# Altium footprint library Test.PcbLib: 245 footprints (part 6 of 17)
Each footprint in its own frame and in the unit in brackets; x right, y up, seen from the top. Pads: shape width x height; smd on the part's side, far side on the other; paste and mask are expansions set on the pad; w line width, h text height; cw(c..) or ccw(c..) is an arc to the next point about the centre after c.
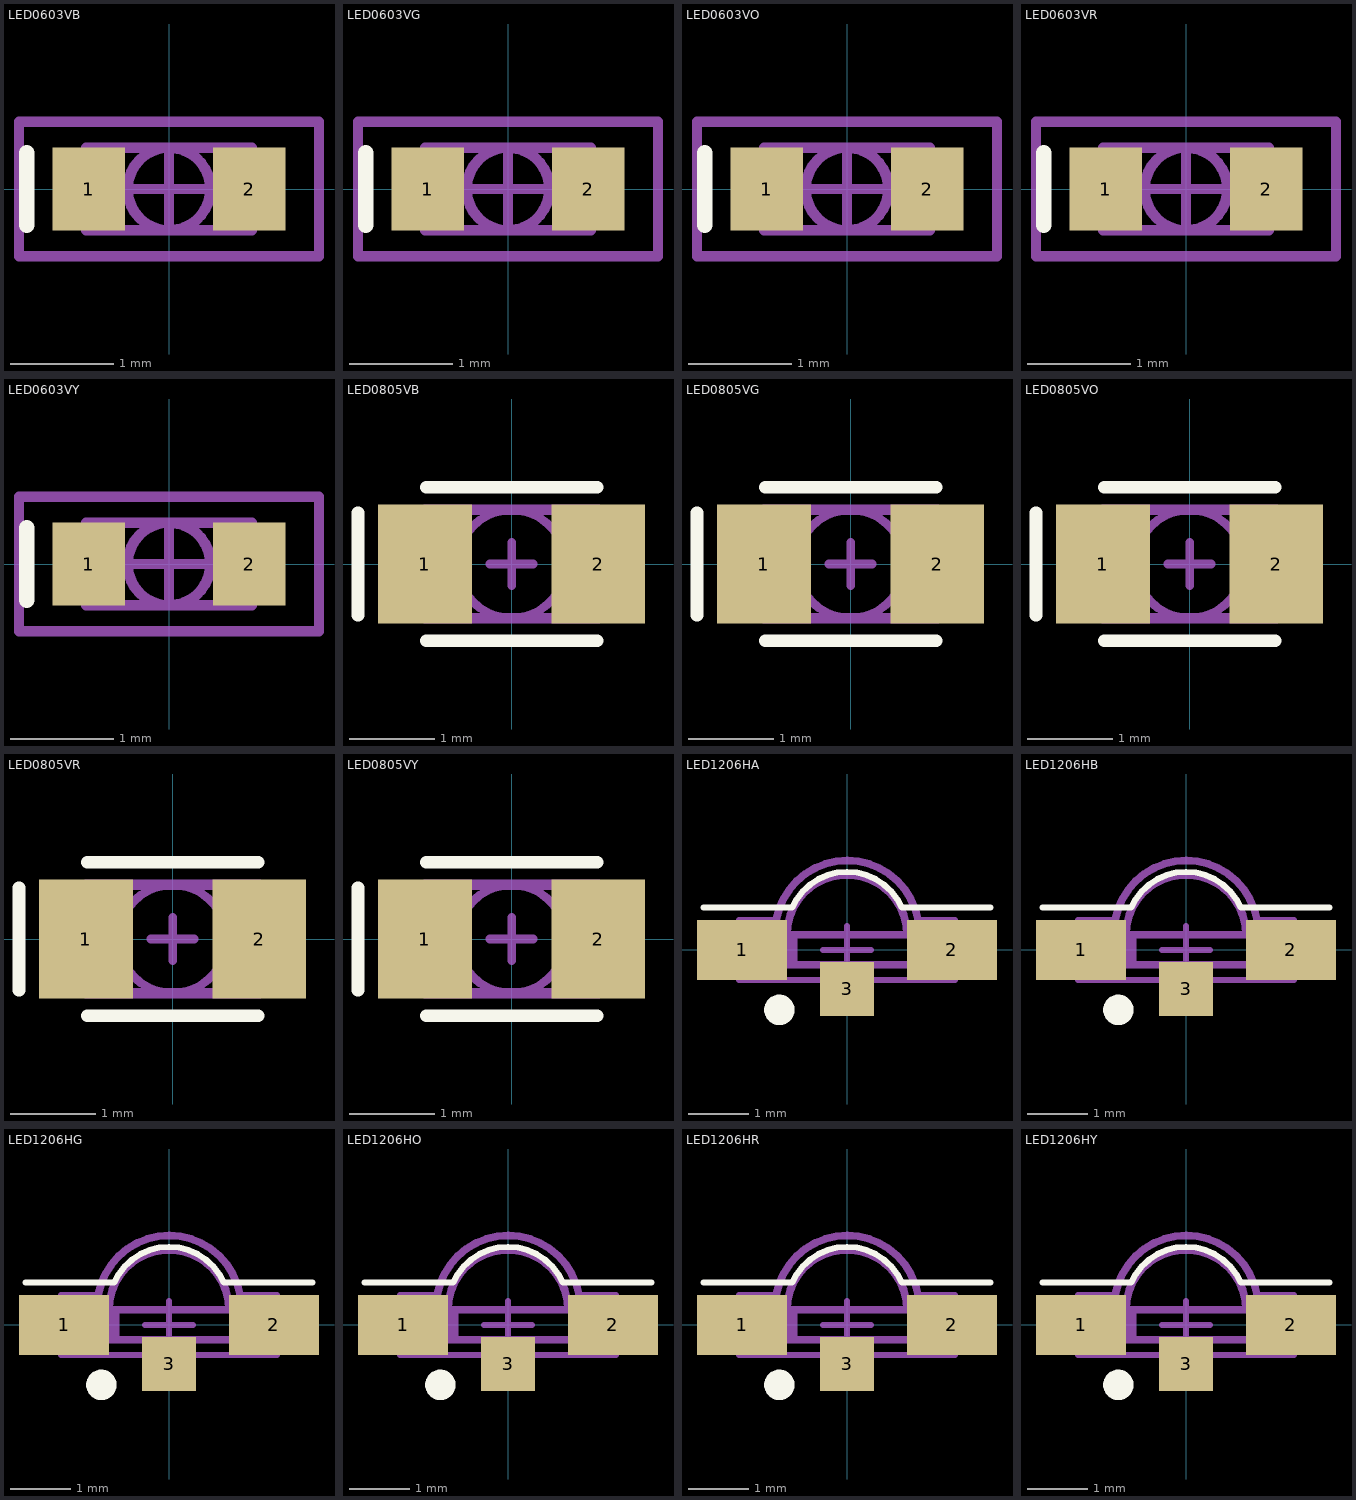
[diagram p5: the footprints below, top view; thin cyan lines are the x and y axes]

## LED0603VB [mm] "LED chip 0603 1.6x0.8x0.6mm vertical Blue"
height 0.6
pads (2):
  rect 0.7x0.8 smd: 1(-0.775,0) 2(0.775,0)
Top Overlay:
  lines w0.15: -1.375,-0.35 -1.375,0.35
Mechanical 13:
  circle w0.102: c0,0 r0.4
  rectangle: -0.8,-0.4 -0.5,0.4
  lines w0.1: -0.8,-0.4 -0.8,0.4 0.8,0.4 0.8,-0.4 -0.8,-0.4
Mechanical 15:
  lines w0.1: -0.4,0 0.4,0 ; 0,-0.4 0,0.4 ; -1.45,-0.65 -1.45,0.65 1.45,0.65 1.45,-0.65 -1.45,-0.65
3D body: height 0.6, standoff 0.3, extent -0.8,-0.4 0.8,0.4
3D body: height 0.3, standoff 0, extent -0.8,-0.4 0.8,0.4

## LED0603VG [mm] "LED chip 0603 1.6x0.8x0.6mm vertical Green"
height 0.6
pads (2):
  rect 0.7x0.8 smd: 1(-0.775,0) 2(0.775,0)
Top Overlay:
  lines w0.15: -1.375,-0.35 -1.375,0.35
Mechanical 13:
  circle w0.102: c0,0 r0.4
  rectangle: -0.8,-0.4 -0.5,0.4
  lines w0.1: -0.8,-0.4 0.8,-0.4 0.8,0.4 -0.8,0.4 -0.8,-0.4
Mechanical 15:
  lines w0.1: -0.4,0 0.4,0 ; 0,-0.4 0,0.4 ; -1.45,-0.65 1.45,-0.65 1.45,0.65 -1.45,0.65 -1.45,-0.65
3D body: height 0.6, standoff 0.3, extent -0.8,-0.4 0.8,0.4
3D body: height 0.3, standoff 0, extent -0.8,-0.4 0.8,0.4

## LED0603VO [mm] "LED chip 0603 1.6x0.8x0.6mm vertical Orange"
height 0.6
pads (2):
  rect 0.7x0.8 smd: 1(-0.775,0) 2(0.775,0)
Top Overlay:
  lines w0.15: -1.375,-0.35 -1.375,0.35
Mechanical 13:
  circle w0.102: c0,0 r0.4
  rectangle: -0.8,-0.4 -0.5,0.4
  lines w0.1: -0.8,-0.4 0.8,-0.4 0.8,0.4 -0.8,0.4 -0.8,-0.4
Mechanical 15:
  lines w0.1: -0.4,0 0.4,0 ; 0,-0.4 0,0.4 ; -1.45,-0.65 1.45,-0.65 1.45,0.65 -1.45,0.65 -1.45,-0.65
3D body: height 0.6, standoff 0.3, extent -0.8,-0.4 0.8,0.4
3D body: height 0.3, standoff 0, extent -0.8,-0.4 0.8,0.4

## LED0603VR [mm] "LED chip 0603 1.6x0.8x0.6mm vertical Red"
height 0.6
pads (2):
  rect 0.7x0.8 smd: 1(-0.775,0) 2(0.775,0)
Top Overlay:
  lines w0.15: -1.375,-0.35 -1.375,0.35
Mechanical 13:
  circle w0.102: c0,0 r0.4
  rectangle: -0.8,-0.4 -0.5,0.4
  lines w0.1: -0.8,-0.4 -0.8,0.4 0.8,0.4 0.8,-0.4 -0.8,-0.4
Mechanical 15:
  lines w0.1: -0.4,0 0.4,0 ; 0,-0.4 0,0.4 ; -1.45,-0.65 -1.45,0.65 1.45,0.65 1.45,-0.65 -1.45,-0.65
3D body: height 0.3, standoff 0, extent -0.8,-0.4 0.8,0.4
3D body: height 0.6, standoff 0.3, extent -0.8,-0.4 0.8,0.4

## LED0603VY [mm] "LED chip 0603 1.6x0.8x0.6mm vertical Yellow"
height 0.6
pads (2):
  rect 0.7x0.8 smd: 1(-0.775,0) 2(0.775,0)
Top Overlay:
  lines w0.15: -1.375,-0.35 -1.375,0.35
Mechanical 13:
  circle w0.102: c0,0 r0.4
  rectangle: -0.8,-0.4 -0.5,0.4
  lines w0.1: -0.8,-0.4 -0.8,0.4 0.8,0.4 0.8,-0.4 -0.8,-0.4
Mechanical 15:
  lines w0.1: -0.4,0 0.4,0 ; 0,-0.4 0,0.4 ; -1.45,-0.65 -1.45,0.65 1.45,0.65 1.45,-0.65 -1.45,-0.65
3D body: height 0.3, standoff 0, extent -0.8,-0.4 0.8,0.4
3D body: height 0.6, standoff 0.3, extent -0.8,-0.4 0.8,0.4

## LED0805VB [mm] "LED 0805 2X1.25mm Blue"
height 1.1
pads (2):
  rect 1.1x1.4 smd: 1(-1.016,0) 2(1.016,0)
Top Overlay:
  lines w0.15: -1.8,-0.6 -1.8,0.6 ; -1,-0.9 1,-0.9 ; -1,0.9 1,0.9
Mechanical 13:
  circle w0.1: c0,0 r0.635
  lines w0.102: -0.9,0.635 -0.9,-0.635 -0.8,-0.635 -0.8,0.635 -0.7,0.635 -0.7,-0.635
  lines w0.127: -1.016,-0.635 1.016,-0.635 1.016,0.635 -1.016,0.635 -1.016,-0.635
Mechanical 15:
  lines w0.1: -0.254,0 0.254,0 ; 0,-0.254 0,0.254
3D body: height 1, standoff 0.3, extent -0.75,-0.625 0.75,0.625
3D body: height 0.3, standoff 0, extent -1.016,-0.635 1.016,0.635

## LED0805VG [mm] "LED 0805 2X1.25mm Green"
height 1.1
pads (2):
  rect 1.1x1.4 smd: 1(-1.016,0) 2(1.016,0)
Top Overlay:
  lines w0.15: -1.8,-0.6 -1.8,0.6 ; -1,-0.9 1,-0.9 ; -1,0.9 1,0.9
Mechanical 13:
  circle w0.1: c0,0 r0.635
  lines w0.102: -0.9,0.635 -0.9,-0.635 -0.8,-0.635 -0.8,0.635 -0.7,0.635 -0.7,-0.635
  lines w0.127: -1.016,-0.635 1.016,-0.635 1.016,0.635 -1.016,0.635 -1.016,-0.635
Mechanical 15:
  lines w0.1: -0.254,0 0.254,0 ; 0,-0.254 0,0.254
3D body: height 1, standoff 0.3, extent -0.75,-0.625 0.75,0.625
3D body: height 0.3, standoff 0, extent -1.016,-0.635 1.016,0.635

## LED0805VO [mm] "LED 0805 2X1.25mm Orange"
height 1.1
pads (2):
  rect 1.1x1.4 smd: 1(-1.016,0) 2(1.016,0)
Top Overlay:
  lines w0.15: -1.8,-0.6 -1.8,0.6 ; -1,-0.9 1,-0.9 ; -1,0.9 1,0.9
Mechanical 13:
  circle w0.1: c0,0 r0.635
  lines w0.102: -0.9,0.635 -0.9,-0.635 -0.8,-0.635 -0.8,0.635 -0.7,0.635 -0.7,-0.635
  lines w0.127: -1.016,-0.635 1.016,-0.635 1.016,0.635 -1.016,0.635 -1.016,-0.635
Mechanical 15:
  lines w0.1: -0.254,0 0.254,0 ; 0,-0.254 0,0.254
3D body: height 1, standoff 0.3, extent -0.75,-0.625 0.75,0.625
3D body: height 0.3, standoff 0, extent -1.016,-0.635 1.016,0.635

## LED0805VR [mm] "LED 0805 2X1.25mm Red"
height 1.1
pads (2):
  rect 1.1x1.4 smd: 1(-1.016,0) 2(1.016,0)
Top Overlay:
  lines w0.15: -1.8,-0.6 -1.8,0.6 ; -1,-0.9 1,-0.9 ; -1,0.9 1,0.9
Mechanical 13:
  circle w0.1: c0,0 r0.635
  lines w0.102: -0.9,0.635 -0.9,-0.635 -0.8,-0.635 -0.8,0.635 -0.7,0.635 -0.7,-0.635
  lines w0.127: -1.016,-0.635 1.016,-0.635 1.016,0.635 -1.016,0.635 -1.016,-0.635
Mechanical 15:
  lines w0.1: -0.254,0 0.254,0 ; 0,-0.254 0,0.254
3D body: height 1, standoff 0.3, extent -0.75,-0.625 0.75,0.625
3D body: height 0.3, standoff 0, extent -1.016,-0.635 1.016,0.635

## LED0805VY [mm] "LED 0805 2X1.25mm Yellow"
height 1.1
pads (2):
  rect 1.1x1.4 smd: 1(-1.016,0) 2(1.016,0)
Top Overlay:
  lines w0.15: -1.8,-0.6 -1.8,0.6 ; -1,-0.9 1,-0.9 ; -1,0.9 1,0.9
Mechanical 13:
  circle w0.1: c0,0 r0.635
  lines w0.102: -0.9,0.635 -0.9,-0.635 -0.8,-0.635 -0.8,0.635 -0.7,0.635 -0.7,-0.635
  lines w0.127: -1.016,-0.635 1.016,-0.635 1.016,0.635 -1.016,0.635 -1.016,-0.635
Mechanical 15:
  lines w0.1: -0.254,0 0.254,0 ; 0,-0.254 0,0.254
3D body: height 1, standoff 0.3, extent -0.75,-0.625 0.75,0.625
3D body: height 0.3, standoff 0, extent -1.016,-0.635 1.016,0.635

## LED1206HA [mm] "LED chip C110 3.2x1.0x1.5mm Side Amber"
height 1.5
pads (3):
  rect 1.5x1 smd: 1(-1.75,0) 2(1.75,0)
  rect 0.9x0.9 smd mask+0.1: 3(0,-0.65)
Top Overlay:
  circle w0.254: c-1.127,-1 r0.127
  lines w0.102: -2.394,0.706 -0.914,0.706 cw(c0,0.3) 0.914,0.706 2.394,0.706
Mechanical 13:
  region: -0.825,0.25 -1.375,0.25 -1.375,-0.25 -0.825,-0.25
  lines w0.127: -1,0.25 cw(c0,0.25) 1,0.25 ; -1.6,-0.25 -1.6,0.25 1.6,0.25 1.6,-0.25 -1.6,-0.25
Mechanical 15:
  lines w0.1: -1.175,0.5 -1.8,0.5 -1.8,-0.5 1.8,-0.5 1.8,0.5 1.175,0.5
  lines w0.102: -0.4,0 0.4,0 ; 0,-0.4 0,0.4
  lines w0.127: -1.177,0.509 cw(c0.003,0.29) 1.183,0.506
3D body: height 1, standoff 0, extent -0.9,-0.25 0.9,0.25
3D body: height 1, standoff 0, extent 0.9,-0.25 1.6,0.25
3D body: height 1, standoff 0, extent -1.6,-0.25 -0.9,0.25
3D body: height 1, standoff 0, extent -1.009,0.25 1.009,1.259
3D body: height 1.02, standoff 0, extent -0.775,-0.325 -0.5,0.25

## LED1206HB [mm] "LED chip C110 3.2x1.0x1.5mm Side Blue"
height 1.5
pads (3):
  rect 1.5x1 smd: 1(-1.75,0) 2(1.75,0)
  rect 0.9x0.9 smd mask+0.1: 3(0,-0.65)
Top Overlay:
  circle w0.254: c-1.127,-1 r0.127
  lines w0.102: -2.394,0.706 -0.914,0.706 cw(c0,0.3) 0.914,0.706 2.394,0.706
Mechanical 13:
  region: -0.825,0.25 -1.375,0.25 -1.375,-0.25 -0.825,-0.25
  lines w0.127: -1,0.25 cw(c0,0.25) 1,0.25 ; -1.6,-0.25 -1.6,0.25 1.6,0.25 1.6,-0.25 -1.6,-0.25
Mechanical 15:
  lines w0.1: -1.175,0.5 -1.8,0.5 -1.8,-0.5 1.8,-0.5 1.8,0.5 1.175,0.5
  lines w0.102: -0.4,0 0.4,0 ; 0,-0.4 0,0.4
  lines w0.127: -1.177,0.509 cw(c0.003,0.29) 1.183,0.506
3D body: height 1, standoff 0, extent -0.9,-0.25 0.9,0.25
3D body: height 1, standoff 0, extent 0.9,-0.25 1.6,0.25
3D body: height 1, standoff 0, extent -1.6,-0.25 -0.9,0.25
3D body: height 1, standoff 0, extent -1.009,0.25 1.009,1.259
3D body: height 1.02, standoff 0, extent -0.775,-0.325 -0.5,0.25

## LED1206HG [mm] "LED chip C110 3.2x1.0x1.5mm Side Green"
height 1.5
pads (3):
  rect 1.5x1 smd: 1(-1.75,0) 2(1.75,0)
  rect 0.9x0.9 smd mask+0.1: 3(0,-0.65)
Top Overlay:
  circle w0.254: c-1.127,-1 r0.127
  lines w0.102: -2.394,0.706 -0.914,0.706 cw(c0,0.3) 0.914,0.706 2.394,0.706
Mechanical 13:
  region: -0.825,0.25 -1.375,0.25 -1.375,-0.25 -0.825,-0.25
  lines w0.127: -1,0.25 cw(c0,0.25) 1,0.25 ; -1.6,-0.25 -1.6,0.25 1.6,0.25 1.6,-0.25 -1.6,-0.25
Mechanical 15:
  lines w0.1: -1.175,0.5 -1.8,0.5 -1.8,-0.5 1.8,-0.5 1.8,0.5 1.175,0.5
  lines w0.102: -0.4,0 0.4,0 ; 0,-0.4 0,0.4
  lines w0.127: -1.177,0.509 cw(c0.003,0.29) 1.183,0.506
3D body: height 1, standoff 0, extent -0.9,-0.25 0.9,0.25
3D body: height 1, standoff 0, extent 0.9,-0.25 1.6,0.25
3D body: height 1, standoff 0, extent -1.6,-0.25 -0.9,0.25
3D body: height 1, standoff 0, extent -1.009,0.25 1.009,1.259
3D body: height 1.02, standoff 0, extent -0.775,-0.325 -0.5,0.25

## LED1206HO [mm] "LED chip C110 3.2x1.0x1.5mm Side Orange"
height 1.5
pads (3):
  rect 1.5x1 smd: 1(-1.75,0) 2(1.75,0)
  rect 0.9x0.9 smd mask+0.1: 3(0,-0.65)
Top Overlay:
  circle w0.254: c-1.127,-1 r0.127
  lines w0.102: -2.394,0.706 -0.914,0.706 cw(c0,0.3) 0.914,0.706 2.394,0.706
Mechanical 13:
  region: -0.825,0.25 -1.375,0.25 -1.375,-0.25 -0.825,-0.25
  lines w0.127: -1,0.25 cw(c0,0.25) 1,0.25 ; -1.6,-0.25 -1.6,0.25 1.6,0.25 1.6,-0.25 -1.6,-0.25
Mechanical 15:
  lines w0.1: -1.175,0.5 -1.8,0.5 -1.8,-0.5 1.8,-0.5 1.8,0.5 1.175,0.5
  lines w0.102: -0.4,0 0.4,0 ; 0,-0.4 0,0.4
  lines w0.127: -1.177,0.509 cw(c0.003,0.29) 1.183,0.506
3D body: height 1, standoff 0, extent -0.9,-0.25 0.9,0.25
3D body: height 1, standoff 0, extent 0.9,-0.25 1.6,0.25
3D body: height 1, standoff 0, extent -1.6,-0.25 -0.9,0.25
3D body: height 1, standoff 0, extent -1.009,0.25 1.009,1.259
3D body: height 1.02, standoff 0, extent -0.775,-0.325 -0.5,0.25

## LED1206HR [mm] "LED chip C110 3.2x1.5x1.0mm Side Red"
height 1
pads (3):
  rect 1.5x1 smd: 1(-1.75,0) 2(1.75,0)
  rect 0.9x0.9 smd mask+0.1: 3(0,-0.65)
Top Overlay:
  circle w0.254: c-1.127,-1 r0.127
  lines w0.102: -2.394,0.706 -0.914,0.706 cw(c0,0.3) 0.914,0.706 2.394,0.706
Mechanical 13:
  region: -0.825,0.25 -1.375,0.25 -1.375,-0.25 -0.825,-0.25
  lines w0.127: -1,0.25 cw(c0,0.25) 1,0.25 ; -1.6,-0.25 -1.6,0.25 1.6,0.25 1.6,-0.25 -1.6,-0.25
Mechanical 15:
  lines w0.1: -1.175,0.5 -1.8,0.5 -1.8,-0.5 1.8,-0.5 1.8,0.5 1.175,0.5
  lines w0.102: -0.4,0 0.4,0 ; 0,-0.4 0,0.4
  lines w0.127: -1.177,0.509 cw(c0.003,0.29) 1.183,0.506
3D body: height 1, standoff 0, extent -0.9,-0.25 0.9,0.25
3D body: height 1, standoff 0, extent 0.9,-0.25 1.6,0.25
3D body: height 1, standoff 0, extent -1.6,-0.25 -0.9,0.25
3D body: height 1, standoff 0, extent -1.009,0.25 1.009,1.259
3D body: height 1.02, standoff 0, extent -0.775,-0.325 -0.5,0.25

## LED1206HY [mm] "LED chip C110 3.2x1.0x1.5mm Side Yellow"
height 1.5
pads (3):
  rect 1.5x1 smd: 1(-1.75,0) 2(1.75,0)
  rect 0.9x0.9 smd mask+0.1: 3(0,-0.65)
Top Overlay:
  circle w0.254: c-1.127,-1 r0.127
  lines w0.102: -2.394,0.706 -0.914,0.706 cw(c0,0.3) 0.914,0.706 2.394,0.706
Mechanical 13:
  region: -0.825,0.25 -1.375,0.25 -1.375,-0.25 -0.825,-0.25
  lines w0.127: -1,0.25 cw(c0,0.25) 1,0.25 ; -1.6,-0.25 1.6,-0.25 1.6,0.25 -1.6,0.25 -1.6,-0.25
Mechanical 15:
  lines w0.1: -1.175,0.5 -1.8,0.5 -1.8,-0.5 1.8,-0.5 1.8,0.5 1.175,0.5
  lines w0.102: -0.4,0 0.4,0 ; 0,-0.4 0,0.4
  lines w0.127: -1.177,0.509 cw(c0.003,0.29) 1.183,0.506
3D body: height 1.02, standoff 0, extent -0.775,-0.325 -0.5,0.25
3D body: height 1, standoff 0, extent -1.009,0.25 1.009,1.259
3D body: height 1, standoff 0, extent -1.6,-0.25 -0.9,0.25
3D body: height 1, standoff 0, extent 0.9,-0.25 1.6,0.25
3D body: height 1, standoff 0, extent -0.9,-0.25 0.9,0.25